# Altium schematic symbol library jlcpcb_2025_04_ferrites_extended_0603.schlib: 833 symbols (part 4 of 4) (continued)
## PZ1608U331-1R2TF
designator FB?  Impedance @ Frequency: 330Ω@100MHz
Ferrite, 330Ω@100MHz, ±25%, 0.14Ω, 1200mA, SMD 0603; Manufacturer: Sunlord; Manufacturer Part Number: PZ1608U331-1R2TF; Package Size: 0603; JLCPCB Basic Part: No; JLCPCB Part Number: C98289; Supplier 1: LCSC; Category: Ferrite Beads; Supplier Part Number 1: C98289; Tolerance: ±25%; Rated Current: 1200mA; DC Resistance: 0.14Ω; RoHS: Yes; ComponentLink1Description: Datasheet; ComponentLink1URL: https://wmsc.lcsc.com/wmsc/upload/file/pdf/v2/lcsc/2310301641_Sunlord-PZ1608U331-1R2TF_C98289.pdf; ComponentLink2Description: JLCPCB Part URL; ComponentLink2URL: https://jlcpcb.com/partdetail/C98289; ComponentLink3Description: LCSC Part URL; ComponentLink3URL: https://lcsc.com/product-detail/Ferrite-Beads_Sunlord-Sunlord-PZ1608U331-1R2TF_C98289.html
footprint FB-0603 (0603 (1608M) Ferrite)
pins: 1, 2

## PZ1608U391-1R0TF
designator FB?  Impedance @ Frequency: 390Ω@100MHz
Ferrite, 390Ω@100MHz, ±25%, 0.14Ω, 1000mA, SMD 0603; Manufacturer: Sunlord; Manufacturer Part Number: PZ1608U391-1R0TF; Package Size: 0603; JLCPCB Basic Part: No; JLCPCB Part Number: C188799; Supplier 1: LCSC; Category: Ferrite Beads; Supplier Part Number 1: C188799; Tolerance: ±25%; Rated Current: 1000mA; DC Resistance: 0.14Ω; RoHS: Yes; ComponentLink1Description: Datasheet; ComponentLink1URL: https://wmsc.lcsc.com/wmsc/upload/file/pdf/v2/lcsc/2310301641_Sunlord-PZ1608U391-1R0TF_C188799.pdf; ComponentLink2Description: JLCPCB Part URL; ComponentLink2URL: https://jlcpcb.com/partdetail/C188799; ComponentLink3Description: LCSC Part URL; ComponentLink3URL: https://lcsc.com/product-detail/Ferrite-Beads_Sunlord-Sunlord-PZ1608U391-1R0TF_C188799.html
footprint FB-0603 (0603 (1608M) Ferrite)
pins: 1, 2

## PZ1608U471-1R0TF
designator FB?  Impedance @ Frequency: 470Ω@100MHz
Ferrite, 470Ω@100MHz, ±25%, 0.2Ω, 1000mA, SMD 0603; Manufacturer: Sunlord; Manufacturer Part Number: PZ1608U471-1R0TF; Package Size: 0603; JLCPCB Basic Part: No; JLCPCB Part Number: C42103; Supplier 1: LCSC; Category: Ferrite Beads; Supplier Part Number 1: C42103; Tolerance: ±25%; Rated Current: 1000mA; DC Resistance: 0.2Ω; RoHS: Yes; ComponentLink1Description: Datasheet; ComponentLink1URL: https://wmsc.lcsc.com/wmsc/upload/file/pdf/v2/lcsc/2310301641_Sunlord-PZ1608U471-1R0TF_C42103.pdf; ComponentLink2Description: JLCPCB Part URL; ComponentLink2URL: https://jlcpcb.com/partdetail/C42103; ComponentLink3Description: LCSC Part URL; ComponentLink3URL: https://lcsc.com/product-detail/Ferrite-Beads_Sunlord-Sunlord-PZ1608U471-1R0TF_C42103.html
footprint FB-0603 (0603 (1608M) Ferrite)
pins: 1, 2

## PZ1608U600-1R0TF
designator FB?  Impedance @ Frequency: 60Ω@100MHz
Ferrite, 60Ω@100MHz, ±25%, 1A, SMD 0603; Manufacturer: Sunlord; Manufacturer Part Number: PZ1608U600-1R0TF; Package Size: 0603; JLCPCB Basic Part: No; JLCPCB Part Number: C370068; Supplier 1: LCSC; Category: Ferrite Beads; Supplier Part Number 1: C370068; Tolerance: ±25%; Rated Current: 1A; RoHS: Yes; ComponentLink1Description: Datasheet; ComponentLink1URL: https://wmsc.lcsc.com/wmsc/upload/file/pdf/v2/lcsc/2310301641_Sunlord-PZ1608U600-1R0TF_C370068.pdf; ComponentLink2Description: JLCPCB Part URL; ComponentLink2URL: https://jlcpcb.com/partdetail/C370068; ComponentLink3Description: LCSC Part URL; ComponentLink3URL: https://lcsc.com/product-detail/Ferrite-Beads_Sunlord-Sunlord-PZ1608U600-1R0TF_C370068.html
pins: 1, 2

## PZ1608U600-2R0TF
designator FB?  Impedance @ Frequency: 60Ω@100MHz
Ferrite, 60Ω@100MHz, ±25%, 2A, SMD 0603; Manufacturer: Sunlord; Manufacturer Part Number: PZ1608U600-2R0TF; Package Size: 0603; JLCPCB Basic Part: No; JLCPCB Part Number: C370069; Supplier 1: LCSC; Category: Ferrite Beads; Supplier Part Number 1: C370069; Tolerance: ±25%; Rated Current: 2A; RoHS: Yes; ComponentLink1Description: Datasheet; ComponentLink1URL: https://wmsc.lcsc.com/wmsc/upload/file/pdf/v2/lcsc/2310301641_Sunlord-PZ1608U600-2R0TF_C370069.pdf; ComponentLink2Description: JLCPCB Part URL; ComponentLink2URL: https://jlcpcb.com/partdetail/C370069; ComponentLink3Description: LCSC Part URL; ComponentLink3URL: https://lcsc.com/product-detail/Ferrite-Beads_Sunlord-Sunlord-PZ1608U600-2R0TF_C370069.html
pins: 1, 2

## PZ1608U600-2R5TF
designator FB?  Impedance @ Frequency: 60Ω@100MHz
Ferrite, 60Ω@100MHz, ±25%, 0.04Ω, 2500mA, SMD 0603; Manufacturer: Sunlord; Manufacturer Part Number: PZ1608U600-2R5TF; Package Size: 0603; JLCPCB Basic Part: No; JLCPCB Part Number: C98288; Supplier 1: LCSC; Category: Ferrite Beads; Supplier Part Number 1: C98288; Tolerance: ±25%; Rated Current: 2500mA; DC Resistance: 0.04Ω; RoHS: Yes; ComponentLink1Description: Datasheet; ComponentLink1URL: https://wmsc.lcsc.com/wmsc/upload/file/pdf/v2/lcsc/2310301641_Sunlord-PZ1608U600-2R5TF_C98288.pdf; ComponentLink2Description: JLCPCB Part URL; ComponentLink2URL: https://jlcpcb.com/partdetail/C98288; ComponentLink3Description: LCSC Part URL; ComponentLink3URL: https://lcsc.com/product-detail/Ferrite-Beads_Sunlord-Sunlord-PZ1608U600-2R5TF_C98288.html
footprint FB-0603 (0603 (1608M) Ferrite)
pins: 1, 2

## PZ1608U600-3R0TF
designator FB?  Impedance @ Frequency: 60Ω@100MHz
Ferrite, 60Ω@100MHz, ±25%, 3A, SMD 0603; Manufacturer: Sunlord; Manufacturer Part Number: PZ1608U600-3R0TF; Package Size: 0603; JLCPCB Basic Part: No; JLCPCB Part Number: C370070; Supplier 1: LCSC; Category: Ferrite Beads; Supplier Part Number 1: C370070; Tolerance: ±25%; Rated Current: 3A; RoHS: Yes; ComponentLink1Description: Datasheet; ComponentLink1URL: https://wmsc.lcsc.com/wmsc/upload/file/pdf/v2/lcsc/2310301641_Sunlord-PZ1608U600-3R0TF_C370070.pdf; ComponentLink2Description: JLCPCB Part URL; ComponentLink2URL: https://jlcpcb.com/partdetail/C370070; ComponentLink3Description: LCSC Part URL; ComponentLink3URL: https://lcsc.com/product-detail/Ferrite-Beads_Sunlord-Sunlord-PZ1608U600-3R0TF_C370070.html
pins: 1, 2

## PZ1608U800-1R0TF
designator FB?  Impedance @ Frequency: 80Ω@100MHz
Ferrite, 80Ω@100MHz, ±25%, 1A, SMD 0603; Manufacturer: Sunlord; Manufacturer Part Number: PZ1608U800-1R0TF; Package Size: 0603; JLCPCB Basic Part: No; JLCPCB Part Number: C370071; Supplier 1: LCSC; Category: Ferrite Beads; Supplier Part Number 1: C370071; Tolerance: ±25%; Rated Current: 1A; RoHS: Yes; ComponentLink1Description: Datasheet; ComponentLink1URL: https://wmsc.lcsc.com/wmsc/upload/file/pdf/v2/lcsc/2310301641_Sunlord-PZ1608U800-1R0TF_C370071.pdf; ComponentLink2Description: JLCPCB Part URL; ComponentLink2URL: https://jlcpcb.com/partdetail/C370071; ComponentLink3Description: LCSC Part URL; ComponentLink3URL: https://lcsc.com/product-detail/Ferrite-Beads_Sunlord-Sunlord-PZ1608U800-1R0TF_C370071.html
pins: 1, 2

## SBH1608S121QSP
designator FB?  Impedance @ Frequency: 120Ω@100MHz
Ferrite, 120Ω@100MHz, ±25%, 70mΩ, 3A, SMD 0603; Manufacturer: Sunltech Tech; Manufacturer Part Number: SBH1608S121QSP; Package Size: 0603; JLCPCB Basic Part: No; JLCPCB Part Number: C216145; Supplier 1: LCSC; Category: Ferrite Beads; Supplier Part Number 1: C216145; Tolerance: ±25%; Rated Current: 3A; DC Resistance: 70mΩ; RoHS: Yes; ComponentLink1Description: Datasheet; ComponentLink1URL: https://wmsc.lcsc.com/wmsc/upload/file/pdf/v2/lcsc/2304140030_Sunltech-Tech-SBH1608S121QSP_C216145.pdf; ComponentLink2Description: JLCPCB Part URL; ComponentLink2URL: https://jlcpcb.com/partdetail/C216145; ComponentLink3Description: LCSC Part URL; ComponentLink3URL: https://lcsc.com/product-detail/Ferrite-Beads_Sunltech-Tech-Sunltech-Tech-SBH1608S121QSP_C216145.html
footprint FB-0603 (0603 (1608M) Ferrite)
pins: 1, 2

## SBH1608S221NSP
designator FB?  Impedance @ Frequency: 220Ω@100MHz
Ferrite, 220Ω@100MHz, ±25%, 90mΩ, 2A, SMD 0603; Manufacturer: Sunltech Tech; Manufacturer Part Number: SBH1608S221NSP; Package Size: 0603; JLCPCB Basic Part: No; JLCPCB Part Number: C216146; Supplier 1: LCSC; Category: Ferrite Beads; Supplier Part Number 1: C216146; Tolerance: ±25%; Rated Current: 2A; DC Resistance: 90mΩ; RoHS: Yes; ComponentLink1Description: Datasheet; ComponentLink1URL: https://wmsc.lcsc.com/wmsc/upload/file/pdf/v2/lcsc/2304140030_Sunltech-Tech-SBH1608S221NSP_C216146.pdf; ComponentLink2Description: JLCPCB Part URL; ComponentLink2URL: https://jlcpcb.com/partdetail/C216146; ComponentLink3Description: LCSC Part URL; ComponentLink3URL: https://lcsc.com/product-detail/Ferrite-Beads_Sunltech-Tech-Sunltech-Tech-SBH1608S221NSP_C216146.html
footprint FB-0603 (0603 (1608M) Ferrite)
pins: 1, 2

## SBH1608S300QSP
designator FB?  Impedance @ Frequency: 30Ω@100MHz
Ferrite, 30Ω@100MHz, ±25%, 40mΩ, 3A, SMD 0603; Manufacturer: Sunltech Tech; Manufacturer Part Number: SBH1608S300QSP; Package Size: 0603; JLCPCB Basic Part: No; JLCPCB Part Number: C216143; Supplier 1: LCSC; Category: Ferrite Beads; Supplier Part Number 1: C216143; Tolerance: ±25%; Rated Current: 3A; DC Resistance: 40mΩ; RoHS: Yes; ComponentLink1Description: Datasheet; ComponentLink1URL: https://wmsc.lcsc.com/wmsc/upload/file/pdf/v2/lcsc/2304140030_Sunltech-Tech-SBH1608S300QSP_C216143.pdf; ComponentLink2Description: JLCPCB Part URL; ComponentLink2URL: https://jlcpcb.com/partdetail/C216143; ComponentLink3Description: LCSC Part URL; ComponentLink3URL: https://lcsc.com/product-detail/Ferrite-Beads_Sunltech-Tech-Sunltech-Tech-SBH1608S300QSP_C216143.html
footprint FB-0603 (0603 (1608M) Ferrite)
pins: 1, 2

## SBH1608S600QSP
designator FB?  Impedance @ Frequency: 60Ω@100MHz
Ferrite, 60Ω@100MHz, ±25%, 40mΩ, 3A, SMD 0603; Manufacturer: Sunltech Tech; Manufacturer Part Number: SBH1608S600QSP; Package Size: 0603; JLCPCB Basic Part: No; JLCPCB Part Number: C216144; Supplier 1: LCSC; Category: Ferrite Beads; Supplier Part Number 1: C216144; Tolerance: ±25%; Rated Current: 3A; DC Resistance: 40mΩ; RoHS: Yes; ComponentLink1Description: Datasheet; ComponentLink1URL: https://wmsc.lcsc.com/wmsc/upload/file/pdf/v2/lcsc/2304140030_Sunltech-Tech-SBH1608S600QSP_C216144.pdf; ComponentLink2Description: JLCPCB Part URL; ComponentLink2URL: https://jlcpcb.com/partdetail/C216144; ComponentLink3Description: LCSC Part URL; ComponentLink3URL: https://lcsc.com/product-detail/Ferrite-Beads_Sunltech-Tech-Sunltech-Tech-SBH1608S600QSP_C216144.html
footprint FB-0603 (0603 (1608M) Ferrite)
pins: 1, 2

## SBH1608S601LSP
designator FB?  Impedance @ Frequency: 600Ω@100MHz
Ferrite, 600Ω@100MHz, ±25%, 200mΩ, 1A, SMD 0603; Manufacturer: Sunltech Tech; Manufacturer Part Number: SBH1608S601LSP; Package Size: 0603; JLCPCB Basic Part: No; JLCPCB Part Number: C216147; Supplier 1: LCSC; Category: Ferrite Beads; Supplier Part Number 1: C216147; Tolerance: ±25%; Rated Current: 1A; DC Resistance: 200mΩ; RoHS: Yes; ComponentLink1Description: Datasheet; ComponentLink1URL: https://wmsc.lcsc.com/wmsc/upload/file/pdf/v2/lcsc/1809291533_Sunltech-Tech-SBH1608S601LSP_C216147.pdf; ComponentLink2Description: JLCPCB Part URL; ComponentLink2URL: https://jlcpcb.com/partdetail/C216147; ComponentLink3Description: LCSC Part URL; ComponentLink3URL: https://lcsc.com/product-detail/Ferrite-Beads_Sunltech-Tech-Sunltech-Tech-SBH1608S601LSP_C216147.html
footprint FB-0603 (0603 (1608M) Ferrite)
pins: 1, 2

## SBJ160808T-252Y-N
designator FB?  Impedance @ Frequency: 2500Ω@100MHz
Ferrite, 2500Ω@100MHz, ±25%, 1Ω, 200mA, SMD 0603; Manufacturer: Chilisin Elec; Manufacturer Part Number: SBJ160808T-252Y-N; Package Size: 0603; JLCPCB Basic Part: No; JLCPCB Part Number: C285656; Supplier 1: LCSC; Category: Ferrite Beads; Supplier Part Number 1: C285656; Tolerance: ±25%; Rated Current: 200mA; DC Resistance: 1Ω; RoHS: Yes; ComponentLink1Description: Datasheet; ComponentLink1URL: https://wmsc.lcsc.com/wmsc/upload/file/pdf/v2/lcsc/2304140030_Chilisin-Elec-SBJ160808T-252Y-N_C285656.pdf; ComponentLink2Description: JLCPCB Part URL; ComponentLink2URL: https://jlcpcb.com/partdetail/C285656; ComponentLink3Description: LCSC Part URL; ComponentLink3URL: https://lcsc.com/product-detail/Ferrite-Beads_Chilisin-Elec-Chilisin-Elec-SBJ160808T-252Y-N_C285656.html
footprint FB-0603 (0603 (1608M) Ferrite)
pins: 1, 2

## SBK160808T-102Y-N
designator FB?  Impedance @ Frequency: 1000Ω@100MHz
Ferrite, 1000Ω@100MHz, ±25%, 0.6Ω, 300mA, SMD 0603; Manufacturer: Chilisin Elec; Manufacturer Part Number: SBK160808T-102Y-N; Package Size: 0603; JLCPCB Basic Part: No; JLCPCB Part Number: C280683; Supplier 1: LCSC; Category: Ferrite Beads; Supplier Part Number 1: C280683; Tolerance: ±25%; Rated Current: 300mA; DC Resistance: 0.6Ω; RoHS: Yes; ComponentLink1Description: Datasheet; ComponentLink1URL: https://wmsc.lcsc.com/wmsc/upload/file/pdf/v2/lcsc/1810262122_Chilisin-Elec-SBK160808T-102Y-N_C280683.pdf; ComponentLink2Description: JLCPCB Part URL; ComponentLink2URL: https://jlcpcb.com/partdetail/C280683; ComponentLink3Description: LCSC Part URL; ComponentLink3URL: https://lcsc.com/product-detail/Ferrite-Beads_Chilisin-Elec-Chilisin-Elec-SBK160808T-102Y-N_C280683.html
footprint FB-0603 (0603 (1608M) Ferrite)
pins: 1, 2

## SBK160808T-110Y-N
designator FB?  Impedance @ Frequency: 11Ω@100MHz
Ferrite, 11Ω@100MHz, ±25%, 0.05Ω, 500mA, SMD 0603; Manufacturer: Chilisin Elec; Manufacturer Part Number: SBK160808T-110Y-N; Package Size: 0603; JLCPCB Basic Part: No; JLCPCB Part Number: C285655; Supplier 1: LCSC; Category: Ferrite Beads; Supplier Part Number 1: C285655; Tolerance: ±25%; Rated Current: 500mA; DC Resistance: 0.05Ω; RoHS: Yes; ComponentLink1Description: Datasheet; ComponentLink1URL: https://wmsc.lcsc.com/wmsc/upload/file/pdf/v2/lcsc/2304140030_Chilisin-Elec-SBK160808T-110Y-N_C285655.pdf; ComponentLink2Description: JLCPCB Part URL; ComponentLink2URL: https://jlcpcb.com/partdetail/C285655; ComponentLink3Description: LCSC Part URL; ComponentLink3URL: https://lcsc.com/product-detail/Ferrite-Beads_Chilisin-Elec-Chilisin-Elec-SBK160808T-110Y-N_C285655.html
footprint FB-0603 (0603 (1608M) Ferrite)
pins: 1, 2

## SBK160808T-121Y-N
designator FB?  Impedance @ Frequency: 120Ω@100MHz
Ferrite, 120Ω@100MHz, ±25%, 0.25Ω, 400mA, SMD 0603; Manufacturer: Chilisin Elec; Manufacturer Part Number: SBK160808T-121Y-N; Package Size: 0603; JLCPCB Basic Part: No; JLCPCB Part Number: C280684; Supplier 1: LCSC; Category: Ferrite Beads; Supplier Part Number 1: C280684; Tolerance: ±25%; Rated Current: 400mA; DC Resistance: 0.25Ω; RoHS: Yes; ComponentLink1Description: Datasheet; ComponentLink1URL: https://wmsc.lcsc.com/wmsc/upload/file/pdf/v2/lcsc/2304140030_Chilisin-Elec-SBK160808T-121Y-N_C280684.pdf; ComponentLink2Description: JLCPCB Part URL; ComponentLink2URL: https://jlcpcb.com/partdetail/C280684; ComponentLink3Description: LCSC Part URL; ComponentLink3URL: https://lcsc.com/product-detail/Ferrite-Beads_Chilisin-Elec-Chilisin-Elec-SBK160808T-121Y-N_C280684.html
footprint FB-0603 (0603 (1608M) Ferrite)
pins: 1, 2

## SBK160808T-202Y-N
designator FB?  Impedance @ Frequency: 2000Ω@100MHz
Ferrite, 2000Ω@100MHz, ±25%, 0.8Ω, 200mA, SMD 0603; Manufacturer: Chilisin Elec; Manufacturer Part Number: SBK160808T-202Y-N; Package Size: 0603; JLCPCB Basic Part: No; JLCPCB Part Number: C285654; Supplier 1: LCSC; Category: Ferrite Beads; Supplier Part Number 1: C285654; Tolerance: ±25%; Rated Current: 200mA; DC Resistance: 0.8Ω; RoHS: Yes; ComponentLink1Description: Datasheet; ComponentLink1URL: https://wmsc.lcsc.com/wmsc/upload/file/pdf/v2/lcsc/1810261322_Chilisin-Elec-SBK160808T-202Y-N_C285654.pdf; ComponentLink2Description: JLCPCB Part URL; ComponentLink2URL: https://jlcpcb.com/partdetail/C285654; ComponentLink3Description: LCSC Part URL; ComponentLink3URL: https://lcsc.com/product-detail/Ferrite-Beads_Chilisin-Elec-Chilisin-Elec-SBK160808T-202Y-N_C285654.html
footprint FB-0603 (0603 (1608M) Ferrite)
pins: 1, 2

## SBK160808T-221Y-N
designator FB?  Impedance @ Frequency: 220Ω@100MHz
Ferrite, 220Ω@100MHz, ±25%, 0.3Ω, 300mA, SMD 0603; Manufacturer: Chilisin Elec; Manufacturer Part Number: SBK160808T-221Y-N; Package Size: 0603; JLCPCB Basic Part: No; JLCPCB Part Number: C280686; Supplier 1: LCSC; Category: Ferrite Beads; Supplier Part Number 1: C280686; Tolerance: ±25%; Rated Current: 300mA; DC Resistance: 0.3Ω; RoHS: Yes; ComponentLink1Description: Datasheet; ComponentLink1URL: https://wmsc.lcsc.com/wmsc/upload/file/pdf/v2/lcsc/2304140030_Chilisin-Elec-SBK160808T-221Y-N_C280686.pdf; ComponentLink2Description: JLCPCB Part URL; ComponentLink2URL: https://jlcpcb.com/partdetail/C280686; ComponentLink3Description: LCSC Part URL; ComponentLink3URL: https://lcsc.com/product-detail/Ferrite-Beads_Chilisin-Elec-Chilisin-Elec-SBK160808T-221Y-N_C280686.html
footprint FB-0603 (0603 (1608M) Ferrite)
pins: 1, 2

## SBK160808T-222Y-N
designator FB?  Impedance @ Frequency: 2200Ω@100MHz
Ferrite, 2200Ω@100MHz, ±25%, 0.8Ω, 200mA, SMD 0603; Manufacturer: Chilisin Elec; Manufacturer Part Number: SBK160808T-222Y-N; Package Size: 0603; JLCPCB Basic Part: No; JLCPCB Part Number: C280687; Supplier 1: LCSC; Category: Ferrite Beads; Supplier Part Number 1: C280687; Tolerance: ±25%; Rated Current: 200mA; DC Resistance: 0.8Ω; RoHS: Yes; ComponentLink1Description: Datasheet; ComponentLink1URL: https://wmsc.lcsc.com/wmsc/upload/file/pdf/v2/lcsc/2304140030_Chilisin-Elec-SBK160808T-222Y-N_C280687.pdf; ComponentLink2Description: JLCPCB Part URL; ComponentLink2URL: https://jlcpcb.com/partdetail/C280687; ComponentLink3Description: LCSC Part URL; ComponentLink3URL: https://lcsc.com/product-detail/Ferrite-Beads_Chilisin-Elec-Chilisin-Elec-SBK160808T-222Y-N_C280687.html
footprint FB-0603 (0603 (1608M) Ferrite)
pins: 1, 2

## SBK160808T-252Y-N
designator FB?  Impedance @ Frequency: 2500Ω@100MHz
Ferrite, 2500Ω@100MHz, ±25%, 0.8Ω, 200mA, SMD 0603; Manufacturer: Chilisin Elec; Manufacturer Part Number: SBK160808T-252Y-N; Package Size: 0603; JLCPCB Basic Part: No; JLCPCB Part Number: C373761; Supplier 1: LCSC; Category: Ferrite Beads; Supplier Part Number 1: C373761; Tolerance: ±25%; Rated Current: 200mA; DC Resistance: 0.8Ω; RoHS: Yes; ComponentLink1Description: Datasheet; ComponentLink1URL: https://wmsc.lcsc.com/wmsc/upload/file/pdf/v2/lcsc/1912111437_Chilisin-Elec-SBK160808T-252Y-N_C373761.pdf; ComponentLink2Description: JLCPCB Part URL; ComponentLink2URL: https://jlcpcb.com/partdetail/C373761; ComponentLink3Description: LCSC Part URL; ComponentLink3URL: https://lcsc.com/product-detail/Ferrite-Beads_Chilisin-Elec-Chilisin-Elec-SBK160808T-252Y-N_C373761.html
footprint FB-0603 (0603 (1608M) Ferrite)
pins: 1, 2

## SBK160808T-300Y-N
designator FB?  Impedance @ Frequency: 30Ω@100MHz
Ferrite, 30Ω@100MHz, ±25%, 0.1Ω, 400mA, SMD 0603; Manufacturer: Chilisin Elec; Manufacturer Part Number: SBK160808T-300Y-N; Package Size: 0603; JLCPCB Basic Part: No; JLCPCB Part Number: C285652; Supplier 1: LCSC; Category: Ferrite Beads; Supplier Part Number 1: C285652; Tolerance: ±25%; Rated Current: 400mA; DC Resistance: 0.1Ω; RoHS: Yes; ComponentLink1Description: Datasheet; ComponentLink1URL: https://wmsc.lcsc.com/wmsc/upload/file/pdf/v2/lcsc/2304140030_Chilisin-Elec-SBK160808T-300Y-N_C285652.pdf; ComponentLink2Description: JLCPCB Part URL; ComponentLink2URL: https://jlcpcb.com/partdetail/C285652; ComponentLink3Description: LCSC Part URL; ComponentLink3URL: https://lcsc.com/product-detail/Ferrite-Beads_Chilisin-Elec-Chilisin-Elec-SBK160808T-300Y-N_C285652.html
footprint FB-0603 (0603 (1608M) Ferrite)
pins: 1, 2

## SBK160808T-301Y-N
designator FB?  Impedance @ Frequency: 300Ω@100MHz
Ferrite, 300Ω@100MHz, ±25%, 0.4Ω, 300mA, SMD 0603; Manufacturer: Chilisin Elec; Manufacturer Part Number: SBK160808T-301Y-N; Package Size: 0603; JLCPCB Basic Part: No; JLCPCB Part Number: C280688; Supplier 1: LCSC; Category: Ferrite Beads; Supplier Part Number 1: C280688; Tolerance: ±25%; Rated Current: 300mA; DC Resistance: 0.4Ω; RoHS: Yes; ComponentLink1Description: Datasheet; ComponentLink1URL: https://wmsc.lcsc.com/wmsc/upload/file/pdf/v2/lcsc/2304140030_Chilisin-Elec-SBK160808T-301Y-N_C280688.pdf; ComponentLink2Description: JLCPCB Part URL; ComponentLink2URL: https://jlcpcb.com/partdetail/C280688; ComponentLink3Description: LCSC Part URL; ComponentLink3URL: https://lcsc.com/product-detail/Ferrite-Beads_Chilisin-Elec-Chilisin-Elec-SBK160808T-301Y-N_C280688.html
footprint FB-0603 (0603 (1608M) Ferrite)
pins: 1, 2

## SBK160808T-471Y-N
designator FB?  Impedance @ Frequency: 470Ω@100MHz
Ferrite, 470Ω@100MHz, ±25%, 0.5Ω, 300mA, SMD 0603; Manufacturer: Chilisin Elec; Manufacturer Part Number: SBK160808T-471Y-N; Package Size: 0603; JLCPCB Basic Part: No; JLCPCB Part Number: C285650; Supplier 1: LCSC; Category: Ferrite Beads; Supplier Part Number 1: C285650; Tolerance: ±25%; Rated Current: 300mA; DC Resistance: 0.5Ω; RoHS: Yes; ComponentLink1Description: Datasheet; ComponentLink1URL: https://wmsc.lcsc.com/wmsc/upload/file/pdf/v2/lcsc/2304140030_Chilisin-Elec-SBK160808T-471Y-N_C285650.pdf; ComponentLink2Description: JLCPCB Part URL; ComponentLink2URL: https://jlcpcb.com/partdetail/C285650; ComponentLink3Description: LCSC Part URL; ComponentLink3URL: https://lcsc.com/product-detail/Ferrite-Beads_Chilisin-Elec-Chilisin-Elec-SBK160808T-471Y-N_C285650.html
footprint FB-0603 (0603 (1608M) Ferrite)
pins: 1, 2

## SBK160808T-600Y-N
designator FB?  Impedance @ Frequency: 60Ω@100MHz
Ferrite, 60Ω@100MHz, ±25%, 0.1Ω, 400mA, SMD 0603; Manufacturer: Chilisin Elec; Manufacturer Part Number: SBK160808T-600Y-N; Package Size: 0603; JLCPCB Basic Part: No; JLCPCB Part Number: C280689; Supplier 1: LCSC; Category: Ferrite Beads; Supplier Part Number 1: C280689; Tolerance: ±25%; Rated Current: 400mA; DC Resistance: 0.1Ω; RoHS: Yes; ComponentLink1Description: Datasheet; ComponentLink1URL: https://wmsc.lcsc.com/wmsc/upload/file/pdf/v2/lcsc/2304140030_Chilisin-Elec-SBK160808T-600Y-N_C280689.pdf; ComponentLink2Description: JLCPCB Part URL; ComponentLink2URL: https://jlcpcb.com/partdetail/C280689; ComponentLink3Description: LCSC Part URL; ComponentLink3URL: https://lcsc.com/product-detail/Ferrite-Beads_Chilisin-Elec-Chilisin-Elec-SBK160808T-600Y-N_C280689.html
footprint FB-0603 (0603 (1608M) Ferrite)
pins: 1, 2

## SBK160808T-601Y-N
designator FB?  Impedance @ Frequency: 600Ω@100MHz
Ferrite, 600Ω@100MHz, ±25%, 0.5Ω, 300mA, SMD 0603; Manufacturer: Chilisin Elec; Manufacturer Part Number: SBK160808T-601Y-N; Package Size: 0603; JLCPCB Basic Part: No; JLCPCB Part Number: C280690; Supplier 1: LCSC; Category: Ferrite Beads; Supplier Part Number 1: C280690; Tolerance: ±25%; Rated Current: 300mA; DC Resistance: 0.5Ω; RoHS: Yes; ComponentLink1Description: Datasheet; ComponentLink1URL: https://wmsc.lcsc.com/wmsc/upload/file/pdf/v2/lcsc/2304140030_Chilisin-Elec-SBK160808T-601Y-N_C280690.pdf; ComponentLink2Description: JLCPCB Part URL; ComponentLink2URL: https://jlcpcb.com/partdetail/C280690; ComponentLink3Description: LCSC Part URL; ComponentLink3URL: https://lcsc.com/product-detail/Ferrite-Beads_Chilisin-Elec-Chilisin-Elec-SBK160808T-601Y-N_C280690.html
footprint FB-0603 (0603 (1608M) Ferrite)
pins: 1, 2

## SBK160808T-750Y-N
designator FB?  Impedance @ Frequency: 75Ω@100MHz
Ferrite, 75Ω@100MHz, SMD 0603; Manufacturer: Chilisin Elec; Manufacturer Part Number: SBK160808T-750Y-N; Package Size: 0603; JLCPCB Basic Part: No; JLCPCB Part Number: C285649; Supplier 1: LCSC; Category: Ferrite Beads; Supplier Part Number 1: C285649; RoHS: Yes; ComponentLink1Description: Datasheet; ComponentLink1URL: https://wmsc.lcsc.com/wmsc/upload/file/pdf/v2/lcsc/2407051006_Chilisin-Elec-SBK160808T-750Y-N_C285649.pdf; ComponentLink2Description: JLCPCB Part URL; ComponentLink2URL: https://jlcpcb.com/partdetail/C285649; ComponentLink3Description: LCSC Part URL; ComponentLink3URL: https://lcsc.com/product-detail/Ferrite-Beads_Chilisin-Elec-Chilisin-Elec-SBK160808T-750Y-N_C285649.html
pins: 1, 2

## SBK160808T-800Y-N
designator FB?  Impedance @ Frequency: 80Ω@100MHz
Ferrite, 80Ω@100MHz, ±25%, 0.15Ω, 400mA, SMD 0603; Manufacturer: Chilisin Elec; Manufacturer Part Number: SBK160808T-800Y-N; Package Size: 0603; JLCPCB Basic Part: No; JLCPCB Part Number: C320425; Supplier 1: LCSC; Category: Ferrite Beads; Supplier Part Number 1: C320425; Tolerance: ±25%; Rated Current: 400mA; DC Resistance: 0.15Ω; RoHS: Yes; ComponentLink1Description: Datasheet; ComponentLink1URL: https://wmsc.lcsc.com/wmsc/upload/file/pdf/v2/lcsc/1912111437_Chilisin-Elec-SBK160808T-800Y-N_C320425.pdf; ComponentLink2Description: JLCPCB Part URL; ComponentLink2URL: https://jlcpcb.com/partdetail/C320425; ComponentLink3Description: LCSC Part URL; ComponentLink3URL: https://lcsc.com/product-detail/Ferrite-Beads_Chilisin-Elec-Chilisin-Elec-SBK160808T-800Y-N_C320425.html
footprint FB-0603 (0603 (1608M) Ferrite)
pins: 1, 2

## SBM1608G221GSP
designator FB?  Impedance @ Frequency: 220Ω@100MHz
Ferrite, 220Ω@100MHz, ±25%, 300mΩ, 500mA, SMD 0603; Manufacturer: Sunltech Tech; Manufacturer Part Number: SBM1608G221GSP; Package Size: 0603; JLCPCB Basic Part: No; JLCPCB Part Number: C216131; Supplier 1: LCSC; Category: Ferrite Beads; Supplier Part Number 1: C216131; Tolerance: ±25%; Rated Current: 500mA; DC Resistance: 300mΩ; RoHS: Yes; ComponentLink1Description: Datasheet; ComponentLink1URL: https://wmsc.lcsc.com/wmsc/upload/file/pdf/v2/lcsc/2304140030_Sunltech-Tech-SBM1608G221GSP_C216131.pdf; ComponentLink2Description: JLCPCB Part URL; ComponentLink2URL: https://jlcpcb.com/partdetail/C216131; ComponentLink3Description: LCSC Part URL; ComponentLink3URL: https://lcsc.com/product-detail/Ferrite-Beads_Sunltech-Tech-Sunltech-Tech-SBM1608G221GSP_C216131.html
footprint FB-0603 (0603 (1608M) Ferrite)
pins: 1, 2

## SBM1608G300JSP
designator FB?  Impedance @ Frequency: 30Ω@100MHz
Ferrite, 30Ω@100MHz, ±25%, 50mΩ, 800mA, SMD 0603; Manufacturer: Sunltech Tech; Manufacturer Part Number: SBM1608G300JSP; Package Size: 0603; JLCPCB Basic Part: No; JLCPCB Part Number: C216128; Supplier 1: LCSC; Category: Ferrite Beads; Supplier Part Number 1: C216128; Tolerance: ±25%; Rated Current: 800mA; DC Resistance: 50mΩ; RoHS: Yes; ComponentLink1Description: Datasheet; ComponentLink1URL: https://wmsc.lcsc.com/wmsc/upload/file/pdf/v2/lcsc/2304140030_Sunltech-Tech-SBM1608G300JSP_C216128.pdf; ComponentLink2Description: JLCPCB Part URL; ComponentLink2URL: https://jlcpcb.com/partdetail/C216128; ComponentLink3Description: LCSC Part URL; ComponentLink3URL: https://lcsc.com/product-detail/Ferrite-Beads_Sunltech-Tech-Sunltech-Tech-SBM1608G300JSP_C216128.html
footprint FB-0603 (0603 (1608M) Ferrite)
pins: 1, 2

## SBM1608G600HSP
designator FB?  Impedance @ Frequency: 60Ω@100MHz
Ferrite, 60Ω@100MHz, ±25%, 100mΩ, 600mA, SMD 0603; Manufacturer: Sunltech Tech; Manufacturer Part Number: SBM1608G600HSP; Package Size: 0603; JLCPCB Basic Part: No; JLCPCB Part Number: C216129; Supplier 1: LCSC; Category: Ferrite Beads; Supplier Part Number 1: C216129; Tolerance: ±25%; Rated Current: 600mA; DC Resistance: 100mΩ; RoHS: Yes; ComponentLink1Description: Datasheet; ComponentLink1URL: https://wmsc.lcsc.com/wmsc/upload/file/pdf/v2/lcsc/2304140030_Sunltech-Tech-SBM1608G600HSP_C216129.pdf; ComponentLink2Description: JLCPCB Part URL; ComponentLink2URL: https://jlcpcb.com/partdetail/C216129; ComponentLink3Description: LCSC Part URL; ComponentLink3URL: https://lcsc.com/product-detail/Ferrite-Beads_Sunltech-Tech-Sunltech-Tech-SBM1608G600HSP_C216129.html
footprint FB-0603 (0603 (1608M) Ferrite)
pins: 1, 2

## SBM1608G601GSP
designator FB?  Impedance @ Frequency: 600Ω@100MHz
Ferrite, 600Ω@100MHz, ±25%, 500mΩ, 500mA, SMD 0603; Manufacturer: Sunltech Tech; Manufacturer Part Number: SBM1608G601GSP; Package Size: 0603; JLCPCB Basic Part: No; JLCPCB Part Number: C216132; Supplier 1: LCSC; Category: Ferrite Beads; Supplier Part Number 1: C216132; Tolerance: ±25%; Rated Current: 500mA; DC Resistance: 500mΩ; RoHS: Yes; ComponentLink1Description: Datasheet; ComponentLink1URL: https://wmsc.lcsc.com/wmsc/upload/file/pdf/v2/lcsc/2304140030_Sunltech-Tech-SBM1608G601GSP_C216132.pdf; ComponentLink2Description: JLCPCB Part URL; ComponentLink2URL: https://jlcpcb.com/partdetail/C216132; ComponentLink3Description: LCSC Part URL; ComponentLink3URL: https://lcsc.com/product-detail/Ferrite-Beads_Sunltech-Tech-Sunltech-Tech-SBM1608G601GSP_C216132.html
footprint FB-0603 (0603 (1608M) Ferrite)
pins: 1, 2

## SZ1608F100TF
designator FB?  Impedance @ Frequency: 10Ω@100MHz
Ferrite, 10Ω@100MHz, 250mΩ, 500mA, SMD 0603; Manufacturer: Sunlord; Manufacturer Part Number: SZ1608F100TF; Package Size: 0603; JLCPCB Basic Part: No; JLCPCB Part Number: C370549; Supplier 1: LCSC; Category: Ferrite Beads; Supplier Part Number 1: C370549; Rated Current: 500mA; DC Resistance: 250mΩ; RoHS: Yes; ComponentLink1Description: Datasheet; ComponentLink1URL: https://wmsc.lcsc.com/wmsc/upload/file/pdf/v2/lcsc/2310301641_Sunlord-SZ1608F100TF_C370549.pdf; ComponentLink2Description: JLCPCB Part URL; ComponentLink2URL: https://jlcpcb.com/partdetail/C370549; ComponentLink3Description: LCSC Part URL; ComponentLink3URL: https://lcsc.com/product-detail/Ferrite-Beads_Sunlord-Sunlord-SZ1608F100TF_C370549.html
pins: 1, 2

## SZ1608F121TF
designator FB?  Impedance @ Frequency: 120Ω@100MHz
Ferrite, 120Ω@100MHz, ±25%, 900mΩ, 200mA, SMD 0603; Manufacturer: Sunlord; Manufacturer Part Number: SZ1608F121TF; Package Size: 0603; JLCPCB Basic Part: No; JLCPCB Part Number: C316344; Supplier 1: LCSC; Category: Ferrite Beads; Supplier Part Number 1: C316344; Tolerance: ±25%; Rated Current: 200mA; DC Resistance: 900mΩ; RoHS: Yes; ComponentLink1Description: Datasheet; ComponentLink1URL: https://wmsc.lcsc.com/wmsc/upload/file/pdf/v2/lcsc/2310301641_Sunlord-SZ1608F121TF_C316344.pdf; ComponentLink2Description: JLCPCB Part URL; ComponentLink2URL: https://jlcpcb.com/partdetail/C316344; ComponentLink3Description: LCSC Part URL; ComponentLink3URL: https://lcsc.com/product-detail/Ferrite-Beads_Sunlord-Sunlord-SZ1608F121TF_C316344.html
footprint FB-0603 (0603 (1608M) Ferrite)
pins: 1, 2

## SZ1608F220TF
designator FB?  Impedance @ Frequency: 22Ω@100MHz
Ferrite, 22Ω@100MHz, ±25%, 350mΩ, 500mA, SMD 0603; Manufacturer: Sunlord; Manufacturer Part Number: SZ1608F220TF; Package Size: 0603; JLCPCB Basic Part: No; JLCPCB Part Number: C96986; Supplier 1: LCSC; Category: Ferrite Beads; Supplier Part Number 1: C96986; Tolerance: ±25%; Rated Current: 500mA; DC Resistance: 350mΩ; RoHS: Yes; ComponentLink1Description: Datasheet; ComponentLink1URL: https://wmsc.lcsc.com/wmsc/upload/file/pdf/v2/lcsc/2310301641_Sunlord-SZ1608F220TF_C96986.pdf; ComponentLink2Description: JLCPCB Part URL; ComponentLink2URL: https://jlcpcb.com/partdetail/C96986; ComponentLink3Description: LCSC Part URL; ComponentLink3URL: https://lcsc.com/product-detail/Ferrite-Beads_Sunlord-Sunlord-SZ1608F220TF_C96986.html
footprint FB-0603 (0603 (1608M) Ferrite)
pins: 1, 2

## SZ1608F470TF
designator FB?  Impedance @ Frequency: 47Ω@100MHz
Ferrite, 47Ω@100MHz, ±25%, 550mΩ, SMD 0603; Manufacturer: Sunlord; Manufacturer Part Number: SZ1608F470TF; Package Size: 0603; JLCPCB Basic Part: No; JLCPCB Part Number: C370550; Supplier 1: LCSC; Category: Ferrite Beads; Supplier Part Number 1: C370550; Tolerance: ±25%; DC Resistance: 550mΩ; RoHS: Yes; ComponentLink1Description: Datasheet; ComponentLink1URL: https://wmsc.lcsc.com/wmsc/upload/file/pdf/v2/lcsc/2310301641_Sunlord-SZ1608F470TF_C370550.pdf; ComponentLink2Description: JLCPCB Part URL; ComponentLink2URL: https://jlcpcb.com/partdetail/C370550; ComponentLink3Description: LCSC Part URL; ComponentLink3URL: https://lcsc.com/product-detail/Ferrite-Beads_Sunlord-Sunlord-SZ1608F470TF_C370550.html
pins: 1, 2

## SZ1608F750TF
designator FB?  Impedance @ Frequency: 75Ω@100MHz
Ferrite, 75Ω@100MHz, ±25%, 700mΩ, 300mA, SMD 0603; Manufacturer: Sunlord; Manufacturer Part Number: SZ1608F750TF; Package Size: 0603; JLCPCB Basic Part: No; JLCPCB Part Number: C22070; Supplier 1: LCSC; Category: Ferrite Beads; Supplier Part Number 1: C22070; Tolerance: ±25%; Rated Current: 300mA; DC Resistance: 700mΩ; RoHS: Yes; ComponentLink1Description: Datasheet; ComponentLink1URL: https://wmsc.lcsc.com/wmsc/upload/file/pdf/v2/lcsc/2310301641_Sunlord-SZ1608F750TF_C22070.pdf; ComponentLink2Description: JLCPCB Part URL; ComponentLink2URL: https://jlcpcb.com/partdetail/C22070; ComponentLink3Description: LCSC Part URL; ComponentLink3URL: https://lcsc.com/product-detail/Ferrite-Beads_Sunlord-Sunlord-SZ1608F750TF_C22070.html
footprint FB-0603 (0603 (1608M) Ferrite)
pins: 1, 2

## SZ1608G102TF
designator FB?  Impedance @ Frequency: 1kΩ@100MHz
Ferrite, 1kΩ@100MHz, ±25%, 1.2Ω, 150mA, SMD 0603; Manufacturer: Sunlord; Manufacturer Part Number: SZ1608G102TF; Package Size: 0603; JLCPCB Basic Part: No; JLCPCB Part Number: C98280; Supplier 1: LCSC; Category: Ferrite Beads; Supplier Part Number 1: C98280; Tolerance: ±25%; Rated Current: 150mA; DC Resistance: 1.2Ω; RoHS: Yes; ComponentLink1Description: Datasheet; ComponentLink1URL: https://wmsc.lcsc.com/wmsc/upload/file/pdf/v2/lcsc/2310301641_Sunlord-SZ1608G102TF_C98280.pdf; ComponentLink2Description: JLCPCB Part URL; ComponentLink2URL: https://jlcpcb.com/partdetail/C98280; ComponentLink3Description: LCSC Part URL; ComponentLink3URL: https://lcsc.com/product-detail/Ferrite-Beads_Sunlord-Sunlord-SZ1608G102TF_C98280.html
footprint FB-0603 (0603 (1608M) Ferrite)
pins: 1, 2

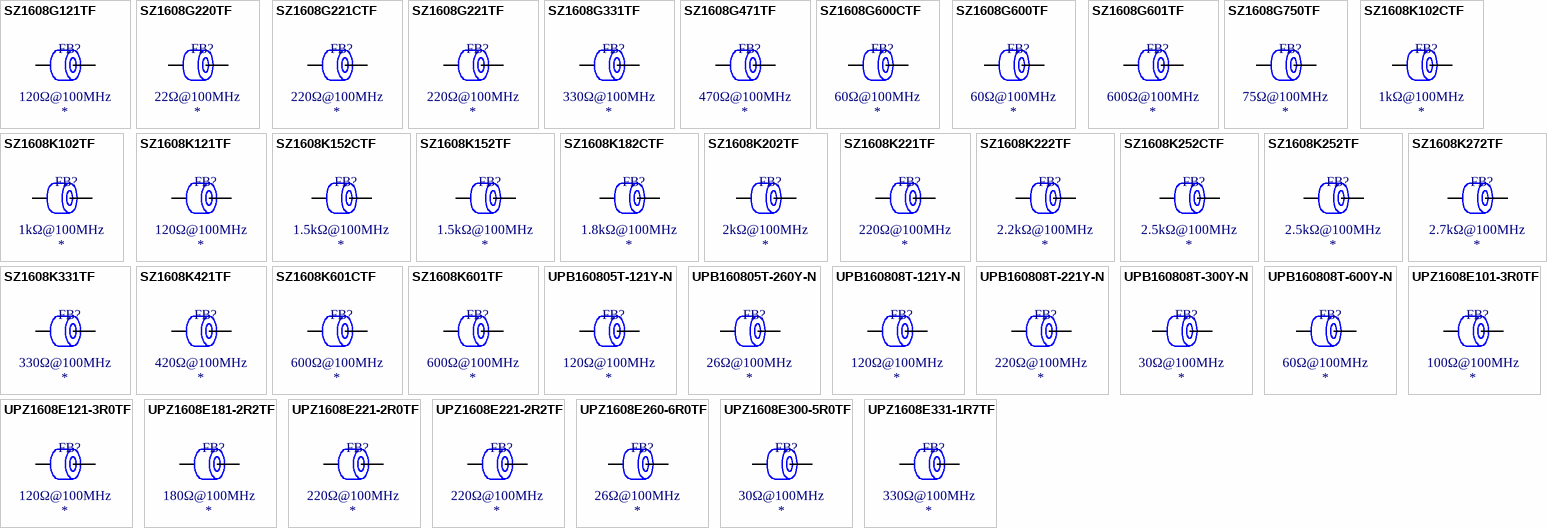
[diagram p19: symbols SZ1608G121TF to UPZ1608E331-1R7TF]

## SZ1608G121TF
designator FB?  Impedance @ Frequency: 120Ω@100MHz
Ferrite, 120Ω@100MHz, ±25%, 450mΩ, 600mA, SMD 0603; Manufacturer: Sunlord; Manufacturer Part Number: SZ1608G121TF; Package Size: 0603; JLCPCB Basic Part: No; JLCPCB Part Number: C98277; Supplier 1: LCSC; Category: Ferrite Beads; Supplier Part Number 1: C98277; Tolerance: ±25%; Rated Current: 600mA; DC Resistance: 450mΩ; RoHS: Yes; ComponentLink1Description: Datasheet; ComponentLink1URL: https://wmsc.lcsc.com/wmsc/upload/file/pdf/v2/lcsc/2310301641_Sunlord-SZ1608G121TF_C98277.pdf; ComponentLink2Description: JLCPCB Part URL; ComponentLink2URL: https://jlcpcb.com/partdetail/C98277; ComponentLink3Description: LCSC Part URL; ComponentLink3URL: https://lcsc.com/product-detail/Ferrite-Beads_Sunlord-Sunlord-SZ1608G121TF_C98277.html
footprint FB-0603 (0603 (1608M) Ferrite)
pins: 1, 2

## SZ1608G220TF
designator FB?  Impedance @ Frequency: 22Ω@100MHz
Ferrite, 22Ω@100MHz, ±25%, 200mΩ, 800mA, SMD 0603; Manufacturer: Sunlord; Manufacturer Part Number: SZ1608G220TF; Package Size: 0603; JLCPCB Basic Part: No; JLCPCB Part Number: C316343; Supplier 1: LCSC; Category: Ferrite Beads; Supplier Part Number 1: C316343; Tolerance: ±25%; Rated Current: 800mA; DC Resistance: 200mΩ; RoHS: Yes; ComponentLink1Description: Datasheet; ComponentLink1URL: https://wmsc.lcsc.com/wmsc/upload/file/pdf/v2/lcsc/2310301641_Sunlord-SZ1608G220TF_C316343.pdf; ComponentLink2Description: JLCPCB Part URL; ComponentLink2URL: https://jlcpcb.com/partdetail/C316343; ComponentLink3Description: LCSC Part URL; ComponentLink3URL: https://lcsc.com/product-detail/Ferrite-Beads_Sunlord-Sunlord-SZ1608G220TF_C316343.html
footprint FB-0603 (0603 (1608M) Ferrite)
pins: 1, 2

## SZ1608G221CTF
designator FB?  Impedance @ Frequency: 220Ω@100MHz
Ferrite, 220Ω@100MHz, ±25%, 550mΩ, SMD 0603; Manufacturer: Sunlord; Manufacturer Part Number: SZ1608G221CTF; Package Size: 0603; JLCPCB Basic Part: No; JLCPCB Part Number: C370553; Supplier 1: LCSC; Category: Ferrite Beads; Supplier Part Number 1: C370553; Tolerance: ±25%; DC Resistance: 550mΩ; RoHS: Yes; ComponentLink1Description: Datasheet; ComponentLink1URL: https://wmsc.lcsc.com/wmsc/upload/file/pdf/v2/lcsc/2310301641_Sunlord-SZ1608G221CTF_C370553.pdf; ComponentLink2Description: JLCPCB Part URL; ComponentLink2URL: https://jlcpcb.com/partdetail/C370553; ComponentLink3Description: LCSC Part URL; ComponentLink3URL: https://lcsc.com/product-detail/Ferrite-Beads_Sunlord-Sunlord-SZ1608G221CTF_C370553.html
pins: 1, 2

## SZ1608G221TF
designator FB?  Impedance @ Frequency: 220Ω@100MHz
Ferrite, 220Ω@100MHz, ±25%, 550mΩ, 500mA, SMD 0603; Manufacturer: Sunlord; Manufacturer Part Number: SZ1608G221TF; Package Size: 0603; JLCPCB Basic Part: No; JLCPCB Part Number: C98278; Supplier 1: LCSC; Category: Ferrite Beads; Supplier Part Number 1: C98278; Tolerance: ±25%; Rated Current: 500mA; DC Resistance: 550mΩ; RoHS: Yes; ComponentLink1Description: Datasheet; ComponentLink1URL: https://wmsc.lcsc.com/wmsc/upload/file/pdf/v2/lcsc/2310301641_Sunlord-SZ1608G221TF_C98278.pdf; ComponentLink2Description: JLCPCB Part URL; ComponentLink2URL: https://jlcpcb.com/partdetail/C98278; ComponentLink3Description: LCSC Part URL; ComponentLink3URL: https://lcsc.com/product-detail/Ferrite-Beads_Sunlord-Sunlord-SZ1608G221TF_C98278.html
footprint FB-0603 (0603 (1608M) Ferrite)
pins: 1, 2

## SZ1608G331TF
designator FB?  Impedance @ Frequency: 330Ω@100MHz
Ferrite, 330Ω@100MHz, ±25%, 700mΩ, 500mA, SMD 0603; Manufacturer: Sunlord; Manufacturer Part Number: SZ1608G331TF; Package Size: 0603; JLCPCB Basic Part: No; JLCPCB Part Number: C98279; Supplier 1: LCSC; Category: Ferrite Beads; Supplier Part Number 1: C98279; Tolerance: ±25%; Rated Current: 500mA; DC Resistance: 700mΩ; RoHS: Yes; ComponentLink1Description: Datasheet; ComponentLink1URL: https://wmsc.lcsc.com/wmsc/upload/file/pdf/v2/lcsc/2310301641_Sunlord-SZ1608G331TF_C98279.pdf; ComponentLink2Description: JLCPCB Part URL; ComponentLink2URL: https://jlcpcb.com/partdetail/C98279; ComponentLink3Description: LCSC Part URL; ComponentLink3URL: https://lcsc.com/product-detail/Ferrite-Beads_Sunlord-Sunlord-SZ1608G331TF_C98279.html
footprint FB-0603 (0603 (1608M) Ferrite)
pins: 1, 2

## SZ1608G471TF
designator FB?  Impedance @ Frequency: 470Ω@100MHz
Ferrite, 470Ω@100MHz, ±25%, 800mΩ, SMD 0603; Manufacturer: Sunlord; Manufacturer Part Number: SZ1608G471TF; Package Size: 0603; JLCPCB Basic Part: No; JLCPCB Part Number: C919157; Supplier 1: LCSC; Category: Ferrite Beads; Supplier Part Number 1: C919157; Tolerance: ±25%; DC Resistance: 800mΩ; RoHS: Yes; ComponentLink1Description: Datasheet; ComponentLink1URL: https://wmsc.lcsc.com/wmsc/upload/file/pdf/v2/lcsc/2310301641_Sunlord-SZ1608G471TF_C919157.pdf; ComponentLink2Description: JLCPCB Part URL; ComponentLink2URL: https://jlcpcb.com/partdetail/C919157; ComponentLink3Description: LCSC Part URL; ComponentLink3URL: https://lcsc.com/product-detail/Ferrite-Beads_Sunlord-Sunlord-SZ1608G471TF_C919157.html
pins: 1, 2

## SZ1608G600CTF
designator FB?  Impedance @ Frequency: 60Ω@100MHz
Ferrite, 60Ω@100MHz, ±25%, 300mΩ, SMD 0603; Manufacturer: Sunlord; Manufacturer Part Number: SZ1608G600CTF; Package Size: 0603; JLCPCB Basic Part: No; JLCPCB Part Number: C370556; Supplier 1: LCSC; Category: Ferrite Beads; Supplier Part Number 1: C370556; Tolerance: ±25%; DC Resistance: 300mΩ; RoHS: Yes; ComponentLink1Description: Datasheet; ComponentLink1URL: https://wmsc.lcsc.com/wmsc/upload/file/pdf/v2/lcsc/2310301641_Sunlord-SZ1608G600CTF_C370556.pdf; ComponentLink2Description: JLCPCB Part URL; ComponentLink2URL: https://jlcpcb.com/partdetail/C370556; ComponentLink3Description: LCSC Part URL; ComponentLink3URL: https://lcsc.com/product-detail/Ferrite-Beads_Sunlord-Sunlord-SZ1608G600CTF_C370556.html
pins: 1, 2

## SZ1608G600TF
designator FB?  Impedance @ Frequency: 60Ω@100MHz
Ferrite, 60Ω@100MHz, ±25%, 300mΩ, 600mA, SMD 0603; Manufacturer: Sunlord; Manufacturer Part Number: SZ1608G600TF; Package Size: 0603; JLCPCB Basic Part: No; JLCPCB Part Number: C370557; Supplier 1: LCSC; Category: Ferrite Beads; Supplier Part Number 1: C370557; Tolerance: ±25%; Rated Current: 600mA; DC Resistance: 300mΩ; RoHS: Yes; ComponentLink1Description: Datasheet; ComponentLink1URL: https://wmsc.lcsc.com/wmsc/upload/file/pdf/v2/lcsc/2310301641_Sunlord-SZ1608G600TF_C370557.pdf; ComponentLink2Description: JLCPCB Part URL; ComponentLink2URL: https://jlcpcb.com/partdetail/C370557; ComponentLink3Description: LCSC Part URL; ComponentLink3URL: https://lcsc.com/product-detail/Ferrite-Beads_Sunlord-Sunlord-SZ1608G600TF_C370557.html
footprint FB-0603 (0603 (1608M) Ferrite)
pins: 1, 2

## SZ1608G601TF
designator FB?  Impedance @ Frequency: 600Ω@100MHz
Ferrite, 600Ω@100MHz, ±25%, 1.1Ω, 200mA, SMD 0603; Manufacturer: Sunlord; Manufacturer Part Number: SZ1608G601TF; Package Size: 0603; JLCPCB Basic Part: No; JLCPCB Part Number: C370558; Supplier 1: LCSC; Category: Ferrite Beads; Supplier Part Number 1: C370558; Tolerance: ±25%; Rated Current: 200mA; DC Resistance: 1.1Ω; RoHS: Yes; ComponentLink1Description: Datasheet; ComponentLink1URL: https://wmsc.lcsc.com/wmsc/upload/file/pdf/v2/lcsc/2310301641_Sunlord-SZ1608G601TF_C370558.pdf; ComponentLink2Description: JLCPCB Part URL; ComponentLink2URL: https://jlcpcb.com/partdetail/C370558; ComponentLink3Description: LCSC Part URL; ComponentLink3URL: https://lcsc.com/product-detail/Ferrite-Beads_Sunlord-Sunlord-SZ1608G601TF_C370558.html
footprint FB-0603 (0603 (1608M) Ferrite)
pins: 1, 2

## SZ1608G750TF
designator FB?  Impedance @ Frequency: 75Ω@100MHz
Ferrite, 75Ω@100MHz, ±25%, SMD 0603; Manufacturer: Sunlord; Manufacturer Part Number: SZ1608G750TF; Package Size: 0603; JLCPCB Basic Part: No; JLCPCB Part Number: C370559; Supplier 1: LCSC; Category: Ferrite Beads; Supplier Part Number 1: C370559; Tolerance: ±25%; RoHS: Yes; ComponentLink1Description: Datasheet; ComponentLink1URL: https://wmsc.lcsc.com/wmsc/upload/file/pdf/v2/lcsc/2310301641_Sunlord-SZ1608G750TF_C370559.pdf; ComponentLink2Description: JLCPCB Part URL; ComponentLink2URL: https://jlcpcb.com/partdetail/C370559; ComponentLink3Description: LCSC Part URL; ComponentLink3URL: https://lcsc.com/product-detail/Ferrite-Beads_Sunlord-Sunlord-SZ1608G750TF_C370559.html
pins: 1, 2

## SZ1608K102CTF
designator FB?  Impedance @ Frequency: 1kΩ@100MHz
Ferrite, 1kΩ@100MHz, ±25%, 800mΩ, SMD 0603; Manufacturer: Sunlord; Manufacturer Part Number: SZ1608K102CTF; Package Size: 0603; JLCPCB Basic Part: No; JLCPCB Part Number: C316342; Supplier 1: LCSC; Category: Ferrite Beads; Supplier Part Number 1: C316342; Tolerance: ±25%; DC Resistance: 800mΩ; RoHS: Yes; ComponentLink1Description: Datasheet; ComponentLink1URL: https://wmsc.lcsc.com/wmsc/upload/file/pdf/v2/lcsc/2310301641_Sunlord-SZ1608K102CTF_C316342.pdf; ComponentLink2Description: JLCPCB Part URL; ComponentLink2URL: https://jlcpcb.com/partdetail/C316342; ComponentLink3Description: LCSC Part URL; ComponentLink3URL: https://lcsc.com/product-detail/Ferrite-Beads_Sunlord-Sunlord-SZ1608K102CTF_C316342.html
pins: 1, 2

## SZ1608K102TF
designator FB?  Impedance @ Frequency: 1kΩ@100MHz
Ferrite, 1kΩ@100MHz, ±25%, 800mΩ, 200mA, SMD 0603; Manufacturer: Sunlord; Manufacturer Part Number: SZ1608K102TF; Package Size: 0603; JLCPCB Basic Part: No; JLCPCB Part Number: C13572; Supplier 1: LCSC; Category: Ferrite Beads; Supplier Part Number 1: C13572; Tolerance: ±25%; Rated Current: 200mA; DC Resistance: 800mΩ; RoHS: Yes; ComponentLink1Description: Datasheet; ComponentLink1URL: https://wmsc.lcsc.com/wmsc/upload/file/pdf/v2/lcsc/2310301641_Sunlord-SZ1608K102TF_C13572.pdf; ComponentLink2Description: JLCPCB Part URL; ComponentLink2URL: https://jlcpcb.com/partdetail/C13572; ComponentLink3Description: LCSC Part URL; ComponentLink3URL: https://lcsc.com/product-detail/Ferrite-Beads_Sunlord-Sunlord-SZ1608K102TF_C13572.html
footprint FB-0603 (0603 (1608M) Ferrite)
pins: 1, 2

## SZ1608K121TF
designator FB?  Impedance @ Frequency: 120Ω@100MHz
Ferrite, 120Ω@100MHz, ±25%, 400mΩ, 600mA, SMD 0603; Manufacturer: Sunlord; Manufacturer Part Number: SZ1608K121TF; Package Size: 0603; JLCPCB Basic Part: No; JLCPCB Part Number: C96987; Supplier 1: LCSC; Category: Ferrite Beads; Supplier Part Number 1: C96987; Tolerance: ±25%; Rated Current: 600mA; DC Resistance: 400mΩ; RoHS: Yes; ComponentLink1Description: Datasheet; ComponentLink1URL: https://wmsc.lcsc.com/wmsc/upload/file/pdf/v2/lcsc/2310301641_Sunlord-SZ1608K121TF_C96987.pdf; ComponentLink2Description: JLCPCB Part URL; ComponentLink2URL: https://jlcpcb.com/partdetail/C96987; ComponentLink3Description: LCSC Part URL; ComponentLink3URL: https://lcsc.com/product-detail/Ferrite-Beads_Sunlord-Sunlord-SZ1608K121TF_C96987.html
footprint FB-0603 (0603 (1608M) Ferrite)
pins: 1, 2

## SZ1608K152CTF
designator FB?  Impedance @ Frequency: 1.5kΩ@100MHz
Ferrite, 1.5kΩ@100MHz, ±25%, 750mΩ, SMD 0603; Manufacturer: Sunlord; Manufacturer Part Number: SZ1608K152CTF; Package Size: 0603; JLCPCB Basic Part: No; JLCPCB Part Number: C370560; Supplier 1: LCSC; Category: Ferrite Beads; Supplier Part Number 1: C370560; Tolerance: ±25%; DC Resistance: 750mΩ; RoHS: Yes; ComponentLink1Description: Datasheet; ComponentLink1URL: https://wmsc.lcsc.com/wmsc/upload/file/pdf/v2/lcsc/2310301641_Sunlord-SZ1608K152CTF_C370560.pdf; ComponentLink2Description: JLCPCB Part URL; ComponentLink2URL: https://jlcpcb.com/partdetail/C370560; ComponentLink3Description: LCSC Part URL; ComponentLink3URL: https://lcsc.com/product-detail/Ferrite-Beads_Sunlord-Sunlord-SZ1608K152CTF_C370560.html
pins: 1, 2

## SZ1608K152TF
designator FB?  Impedance @ Frequency: 1.5kΩ@100MHz
Ferrite, 1.5kΩ@100MHz, ±25%, 800mΩ, 200mA, SMD 0603; Manufacturer: Sunlord; Manufacturer Part Number: SZ1608K152TF; Package Size: 0603; JLCPCB Basic Part: No; JLCPCB Part Number: C316341; Supplier 1: LCSC; Category: Ferrite Beads; Supplier Part Number 1: C316341; Tolerance: ±25%; Rated Current: 200mA; DC Resistance: 800mΩ; RoHS: Yes; ComponentLink1Description: Datasheet; ComponentLink1URL: https://wmsc.lcsc.com/wmsc/upload/file/pdf/v2/lcsc/2310301641_Sunlord-SZ1608K152TF_C316341.pdf; ComponentLink2Description: JLCPCB Part URL; ComponentLink2URL: https://jlcpcb.com/partdetail/C316341; ComponentLink3Description: LCSC Part URL; ComponentLink3URL: https://lcsc.com/product-detail/Ferrite-Beads_Sunlord-Sunlord-SZ1608K152TF_C316341.html
footprint FB-0603 (0603 (1608M) Ferrite)
pins: 1, 2

## SZ1608K182CTF
designator FB?  Impedance @ Frequency: 1.8kΩ@100MHz
Ferrite, 1.8kΩ@100MHz, ±25%, 850mΩ, 200mA, SMD 0603; Manufacturer: Sunlord; Manufacturer Part Number: SZ1608K182CTF; Package Size: 0603; JLCPCB Basic Part: No; JLCPCB Part Number: C279972; Supplier 1: LCSC; Category: Ferrite Beads; Supplier Part Number 1: C279972; Tolerance: ±25%; Rated Current: 200mA; DC Resistance: 850mΩ; RoHS: Yes; ComponentLink1Description: Datasheet; ComponentLink1URL: https://wmsc.lcsc.com/wmsc/upload/file/pdf/v2/lcsc/2310301641_Sunlord-SZ1608K182CTF_C279972.pdf; ComponentLink2Description: JLCPCB Part URL; ComponentLink2URL: https://jlcpcb.com/partdetail/C279972; ComponentLink3Description: LCSC Part URL; ComponentLink3URL: https://lcsc.com/product-detail/Ferrite-Beads_Sunlord-Sunlord-SZ1608K182CTF_C279972.html
footprint FB-0603 (0603 (1608M) Ferrite)
pins: 1, 2

## SZ1608K202TF
designator FB?  Impedance @ Frequency: 2kΩ@100MHz
Ferrite, 2kΩ@100MHz, ±25%, 1Ω, 200mA, SMD 0603; Manufacturer: Sunlord; Manufacturer Part Number: SZ1608K202TF; Package Size: 0603; JLCPCB Basic Part: No; JLCPCB Part Number: C370561; Supplier 1: LCSC; Category: Ferrite Beads; Supplier Part Number 1: C370561; Tolerance: ±25%; Rated Current: 200mA; DC Resistance: 1Ω; RoHS: Yes; ComponentLink1Description: Datasheet; ComponentLink1URL: https://wmsc.lcsc.com/wmsc/upload/file/pdf/v2/lcsc/2310301641_Sunlord-SZ1608K202TF_C370561.pdf; ComponentLink2Description: JLCPCB Part URL; ComponentLink2URL: https://jlcpcb.com/partdetail/C370561; ComponentLink3Description: LCSC Part URL; ComponentLink3URL: https://lcsc.com/product-detail/Ferrite-Beads_Sunlord-Sunlord-SZ1608K202TF_C370561.html
footprint FB-0603 (0603 (1608M) Ferrite)
pins: 1, 2
